# Altium integrated library Halleffect_DevBoard - Copy.IntLib: 7 symbols
Pins are listed as number, name and electrical type; pins without a type are passive.

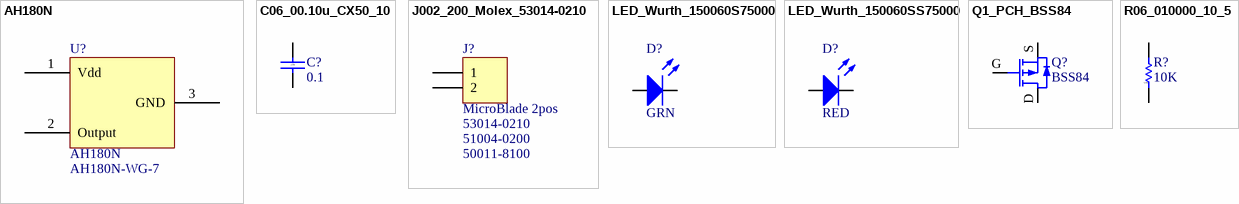
[diagram p0: symbols AH180N to R06_010000_10_5]

## AH180N
designator U?  PartNumber: AH180N-WG-7
IC, Hall Effect Switch, AH180N, SOT23; Manufacturer: Diodes Inc; ComponentLink1Description: Supplier Link; ComponentLink1URL: http://www.digikey.com/product-detail/en/diodes-incorporated/AH180N-WG-7/AH180N-WG-7DICT-ND/2334666
footprint Q_SOT23-3 (SOT23, 3-Leads, Body 3.016x2.8mm, Pitch 0.95mm)
pins: 1 Vdd, 2 Output, 3 GND

## C06_00.10u_CX50_10
designator C?, comment value 0.1  (hidden comment: Cap_Ceramic)
Cap, ceramic, 0.1uF, 50V, 10% X7R, 0603; Manufacturer: Kemet; Part Number: C0603C104K5RACTU; Special: special; Notes: *; HelpURL: *; PackageDescription: 0603; ComponentLink1URL: http://www.digikey.com/product-detail/en/kemet/C0603C104K5RACTU/399-5089-1-ND/1465623; ComponentLink1Description: Supplier Link; Voltage: 50V
simulation model CAP (Capacitor)
signal-integrity model Cap
footprint CAP_0603 (Capacitor 0603 package)
pins: 1, 2
text: SMT

## J002_200_Molex_53014-0210
designator J?, comment MicroBlade 2pos  Part Number: 53014-0210  Mate Housing: 51004-0200  ContactBulk: 50011-8100
Connector, header, 2pos, 2.00mm pitch MicroBlade; Manufacturer: Molex; ContactReel: 50011-8000; PackageDescription: SMT; Notes: *; HelpURL: C:\Dropbox\Component Datasheets\(J) Connectors\Molex_530140610_sd.pdf; ComponentLink1Description: Supplier Link; ComponentLink1URL: http://www.digikey.com/product-search/en?vendor=0&keywords=53014-0210
footprint Molex_2P-2.00_53014-0210 (Connector Header 2pos 2mmp Vertical through hole)
pins: 1, 2

## LED_Wurth_150060S75000
designator D?, comment Color: GRN  (hidden comment: 150060S75000)
LED, GRN, 2V, 0603 SMD; Manufacturer: Wurth Electronics Inc.; PackageReference: SMD; PackageDescription: 0603; Part Number: 150060S75000; ComponentLink1URL: https://www.digikey.com/product-detail/en/wurth-electronics-inc/150060VS75000/732-4980-1-ND/4489904; ComponentLink1Description: Supplier Link; Vf typical: 2V; HelpURL: http://katalog.we-online.de/led/datasheet/150060VS75000.pdf
footprint LED_0603_A (Chip LED, 2-Leads, Body 1.6x0.8mm, IPC Medium Density)
pins: 1, 2

## LED_Wurth_150060SS75000
designator D?, comment Color: RED  (hidden comment: 150060SS75000)
LED, RED, 1.9V, 0603 SMD; Manufacturer: Wurth Electronics Inc.; PackageReference: SMD; PackageDescription: 0603; Part Number: 150060SS75000; ComponentLink1URL: https://www.digikey.com/product-detail/en/wurth-electronics-inc/150060SS75000/732-4979-1-ND/4489902; ComponentLink1Description: Supplier Link; Vf typical: 1.9V; HelpURL: http://katalog.we-online.de/led/datasheet/150060SS75000.pdf
footprint LED_0603_A (Chip LED, 2-Leads, Body 1.6x0.8mm, IPC Medium Density)
pins: 1, 2

## Q1_PCH_BSS84
designator Q?, comment BSS84
Transistor, P-CH MOSFET, 50V, RDS on 10Ohm, 130mA; Manufacturer: Fairchild Semiconductor; PackageReference: SOT-23; PackageDescription: SOT-23; Part Number: BSS84; HelpURL: https://www.fairchildsemi.com/datasheets/BS/BSS84.pdf; Notes: *; ComponentLink1URL: http://www.digikey.com/product-detail/en/fairchild-semiconductor/BSS84/BSS84CT-ND/244297; ComponentLink1Description: Supplier Link
footprint Q_SOT23-3_PCH (SOT23, 3-Leads, Body 3.016x2.8mm, Pitch 0.95mm)
pins: D, G, S

## R06_010000_10_5
designator R?, comment value 10K  (hidden comment: Resistor)
Resistor, 10k ohm, 1/10 watt, 5%, 0603 SMD; Manufacturer: Panasonic; Part Number: ERJ-3GEYJ103V; Wattage: 1/10; Notes: *; PackageDescription: 0603; HelpURL: *; ComponentLink1URL: http://www.digikey.com/product-detail/en/ERJ-3GEYJ103V/P10KGCT-ND/134717; ComponentLink1Description: Supplier Link; Tolerance: 5%
simulation model RESISTOR (Resistor)
signal-integrity model Res
footprint RES_0603 (Resistor 0603 package)
pins: 1, 2
text: SMT